# Altium footprint library AmbiqAndromeda.PcbLib: 48 footprints (part 3 of 3)
Each footprint in its own frame and in the unit in brackets; x right, y up, seen from the top. Pads: shape width x height; smd on the part's side, far side on the other; paste and mask are expansions set on the pad; w line width, h text height; cw(c..) or ccw(c..) is an arc to the next point about the centre after c.
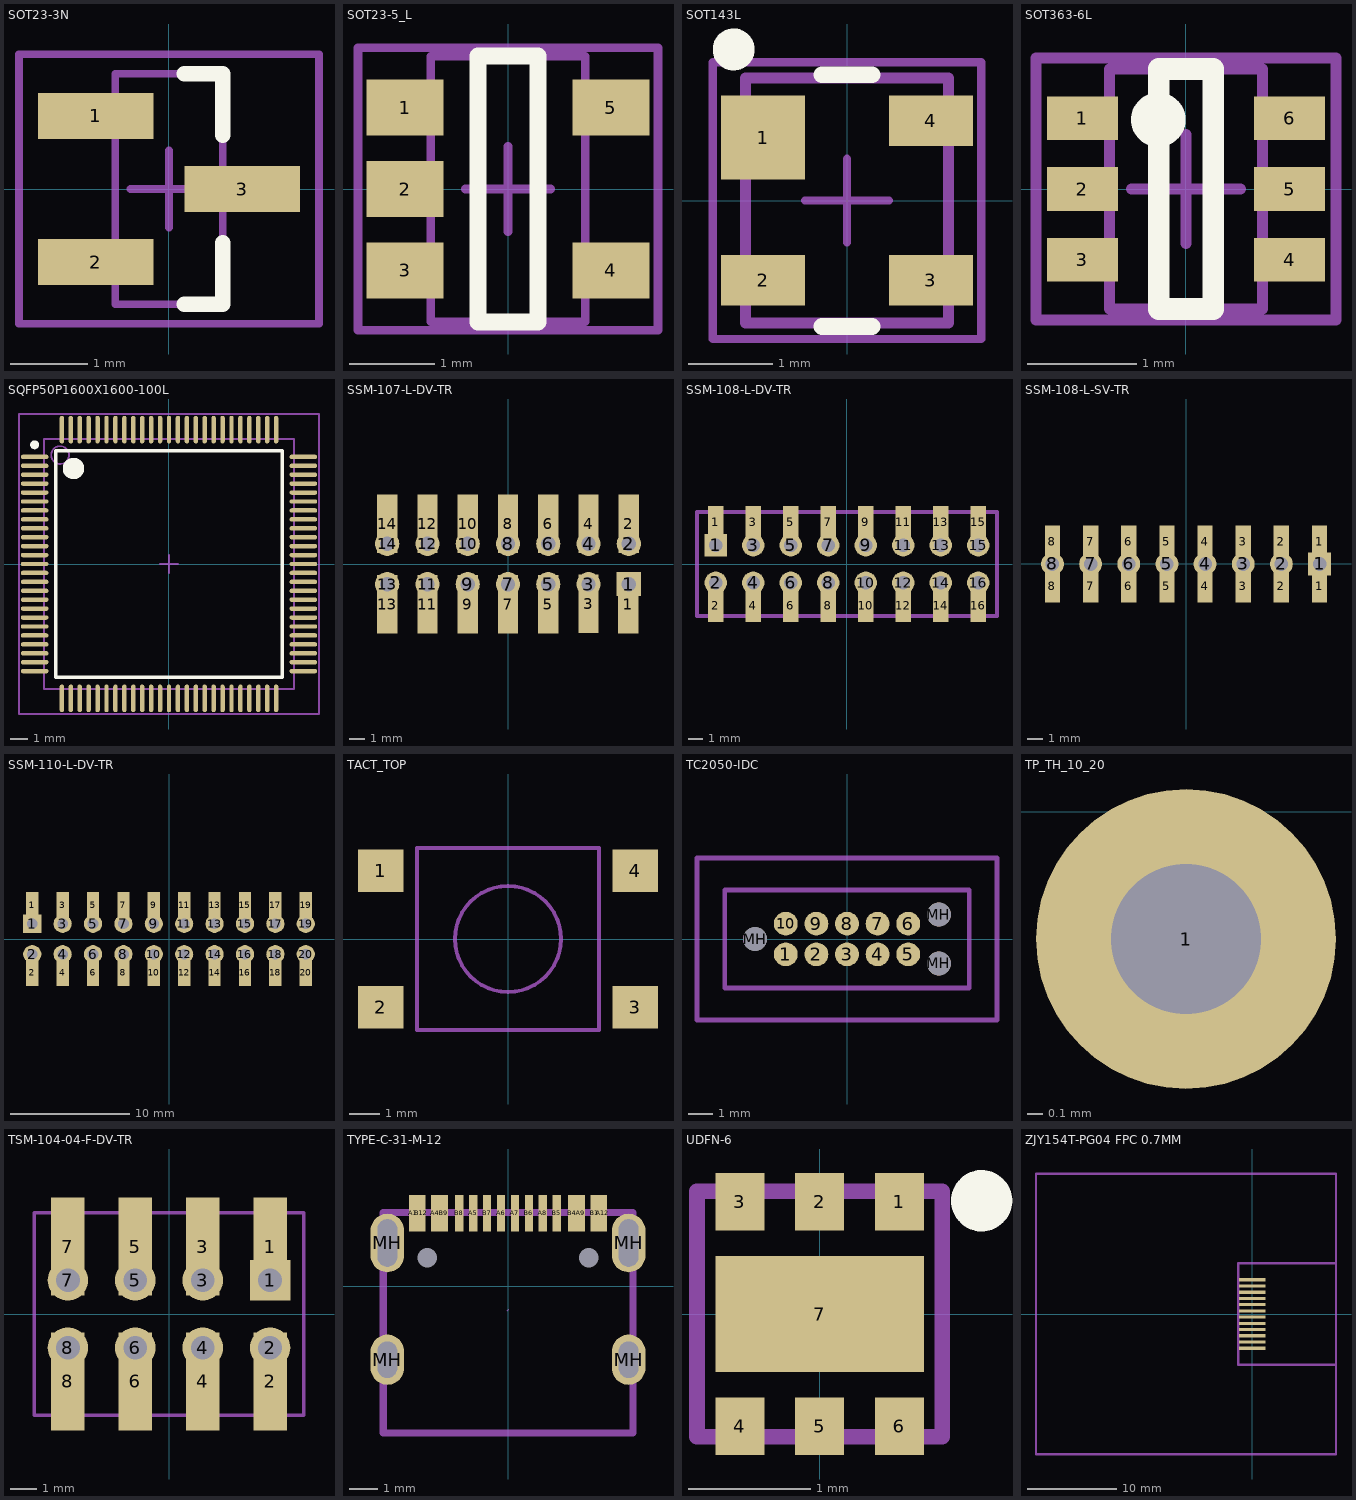
[diagram p2: the footprints below, top view; thin cyan lines are the x and y axes]

## SOT23-3N [mm] "SOT23, 3-Leads, Body 2.9x1.3mm, Pitch 0.95mm, Lead Span 2.5mm, IPC Medium Density"
height 1.1
pads (3):
  rect 1.5x0.6 smd: 1(-0.95,0.95) 2(-0.95,-0.95) 3(0.95,0)
Top Overlay:
  lines w0.2: 0.2,-1.5 0.7,-1.5 0.7,-0.7 ; 0.2,1.5 0.7,1.5 0.7,0.7
Mechanical 13:
  lines w0.1: -0.7,-1.5 -0.7,1.5 0.7,1.5 0.7,-1.5 -0.7,-1.5
Mechanical 15:
  lines w0.1: -0.5,0 0.5,0 ; 0,-0.5 0,0.5 ; -1.95,-1.75 -1.95,1.75 1.95,1.75 1.95,-1.75 -1.95,-1.75
3D body "SOT23.STEP": height 1.08, standoff 0, extent -1.345,-1.5 1.295,1.5

## SOT23-5_L [mm] "SOT23, 5-Leads, Body 2.9x1.6mm, Pitch 0.95mm, Lead Span 2.8mm, IPC High Density"
height 1.45
pads (5):
  rect 0.9x0.65 smd: 1(-1.2,0.95) 2(-1.2,0) 3(-1.2,-0.95) 4(1.2,-0.95) 5(1.2,0.95)
Top Overlay:
  lines w0.2: -0.35,-1.55 -0.35,1.55 0.35,1.55 0.35,-1.55 -0.35,-1.55
Mechanical 13:
  lines w0.1: -0.9,-1.55 0.9,-1.55 0.9,1.55 -0.9,1.55 -0.9,-1.55
Mechanical 15:
  lines w0.1: -0.5,0 0.5,0 ; 0,-0.5 0,0.5 ; -1.75,-1.65 1.75,-1.65 1.75,1.65 -1.75,1.65 -1.75,-1.65
3D body "User Library-SOT23-5.STEP": height 1.09, standoff -0.01, extent -1.451,-1.473 1.349,1.426

## SOT143L [mm] "SOT143, 4-Leads, Body 2.9x1.3mm, Pitch 1.9mm, Lead Span 2.5mm, IPC High Density"
height 1.1
pads (4):
  rect 1x1 smd: 1(-1,0.75)
  rect 1x0.6 smd: 2(-1,-0.95) 3(1,-0.95) 4(1,0.95)
Top Overlay:
  circle w0.25: c-1.35,1.8 r0.125
  lines w0.2: -0.3,-1.5 0.3,-1.5 ; -0.3,1.5 0.3,1.5
Mechanical 13:
  lines w0.127: -1.21,-1.46 -1.21,1.46 1.21,1.46 1.21,-1.46 -1.21,-1.46
Mechanical 15:
  lines w0.1: -0.5,0 0.5,0 ; 0,-0.5 0,0.5 ; -1.6,-1.65 -1.6,1.65 1.6,1.65 1.6,-1.65 -1.6,-1.65
3D body "User Library-sot143.STEP": height 1, standoff 0, extent -1.21,-1.46 1.21,1.46

## SOT363-6L [mm] "SOT363, 6-Leads, Body 2x1.3mm, Pitch 0.65mm, Lead Span 2.1mm, IPC High Density"
height 1
pads (6):
  rect 0.65x0.4 smd: 1(-0.95,0.65) 2(-0.95,0) 3(-0.95,-0.65) 4(0.95,-0.65) 5(0.95,0) 6(0.95,0.65)
Top Overlay:
  circle w0.25: c-0.254,0.635 r0.125
  lines w0.2: -0.25,-1.1 -0.25,1.1 0.25,1.1 0.25,-1.1 -0.25,-1.1
Mechanical 13:
  lines w0.1: -0.7,-1.1 0.7,-1.1 0.7,1.1 -0.7,1.1 -0.7,-1.1
Mechanical 15:
  lines w0.1: -0.5,0 0.5,0 ; 0,-0.5 0,0.5 ; -1.375,-1.2 1.375,-1.2 1.375,1.2 -1.375,1.2 -1.375,-1.2
3D body "User Library-sot363.STEP": height 1, standoff 0, extent -1.15,-1.05 1.15,1.05

## SQFP50P1600X1600-100L [mm] "Shrink QFP, 100-Leads, Body 14x14mm, Pitch 0.5mm, IPC High Density"
height 2.2
pads (100):
  oval 1.55x0.25 smd: 1(-7.525,6) 2(-7.525,5.5) 3(-7.525,5) 4(-7.525,4.5) 5(-7.525,4) 6(-7.525,3.5) 7(-7.525,3) 8(-7.525,2.5) 9(-7.525,2) 10(-7.525,1.5) 11(-7.525,1) 12(-7.525,0.5) 13(-7.525,0) 14(-7.525,-0.5) 15(-7.525,-1) 16(-7.525,-1.5) 17(-7.525,-2) 18(-7.525,-2.5) 19(-7.525,-3) 20(-7.525,-3.5) 21(-7.525,-4) 22(-7.525,-4.5) 23(-7.525,-5) 24(-7.525,-5.5) 25(-7.525,-6) 51(7.525,-6) 52(7.525,-5.5) 53(7.525,-5) 54(7.525,-4.5) 55(7.525,-4) 56(7.525,-3.5) 57(7.525,-3) 58(7.525,-2.5) 59(7.525,-2) 60(7.525,-1.5) 61(7.525,-1) 62(7.525,-0.5) 63(7.525,0) 64(7.525,0.5) 65(7.525,1) 66(7.525,1.5) 67(7.525,2) 68(7.525,2.5) 69(7.525,3) 70(7.525,3.5) 71(7.525,4) 72(7.525,4.5) 73(7.525,5) 74(7.525,5.5) 75(7.525,6)
  oval 0.25x1.55 smd: 26(-6,-7.525) 27(-5.5,-7.525) 28(-5,-7.525) 29(-4.5,-7.525) 30(-4,-7.525) 31(-3.5,-7.525) 32(-3,-7.525) 33(-2.5,-7.525) 34(-2,-7.525) 35(-1.5,-7.525) 36(-1,-7.525) 37(-0.5,-7.525) 38(0,-7.525) 39(0.5,-7.525) 40(1,-7.525) 41(1.5,-7.525) 42(2,-7.525) 43(2.5,-7.525) 44(3,-7.525) 45(3.5,-7.525) 46(4,-7.525) 47(4.5,-7.525) 48(5,-7.525) 49(5.5,-7.525) 50(6,-7.525) 76(6,7.525) 77(5.5,7.525) 78(5,7.525) 79(4.5,7.525) 80(4,7.525) 81(3.5,7.525) 82(3,7.525) 83(2.5,7.525) 84(2,7.525) 85(1.5,7.525) 86(1,7.525) 87(0.5,7.525) 88(0,7.525) 89(-0.5,7.525) 90(-1,7.525) 91(-1.5,7.525) 92(-2,7.525) 93(-2.5,7.525) 94(-3,7.525) 95(-3.5,7.525) 96(-4,7.525) 97(-4.5,7.525) 98(-5,7.525) 99(-5.5,7.525) 100(-6,7.525)
Top Overlay:
  circle w0.25: c-7.525,6.675 r0.125
  circle w0.6: c-5.35,5.35 r0.3
  lines w0.2: -6.35,-6.35 -6.35,6.35 6.35,6.35 6.35,-6.35 -6.35,-6.35
Mechanical 13:
  circle w0.1: c-6.1,6.1 r0.5
  lines w0.1: -7,-7 -7,7 7,7 7,-7 -7,-7
Mechanical 15:
  lines w0.1: -0.5,0 0.5,0 ; 0,-0.5 0,0.5 ; -8.4,-8.4 -8.4,8.4 8.4,8.4 8.4,-8.4 -8.4,-8.4
3D body "LQFP100-14x14.STEP": height 1.45, standoff 0, extent -8,-8 8,8

## SSM-107-L-DV-TR [mil]
pads (28):
  rect 50x145 smd mask+2: 1(298.48,-100) 2(300,100) 3(200,-99.01) 4(200,100) 5(100,-100) 6(100,100) 7(0,-100) 8(0,100) 9(-100,-100) 10(-100,100) 11(-200,-100) 12(-200,100) 13(-300,-100) 14(-300,100)
  rect 60x60 hole 35.43: 1(300,-50)
  rrect100% 60x60 hole 35.43: 2(300,50) 3(200,-50) 4(200,50) 5(100,-50) 6(100,50) 7(0,-50) 8(0,50) 9(-100,-50) 10(-100,50) 11(-200,-50) 12(-200,50) 13(-300,-50) 14(-300,50)
3D body "SSM-107-L-DV.stp": height 290, standoff -2, extent -349.99,-138.5 350.01,138.5

## SSM-108-L-DV-TR [mil]
pads (32):
  rect 60x60 hole 35.43: 1(-350,50)
  rect 40.16x87.4 smd: 1(-350,111.26) 2(-350,-111.26) 3(-250,111.26) 4(-250,-111.26) 5(-150,111.26) 6(-150,-111.26) 7(-50,111.26) 8(-50,-111.26) 9(50,111.26) 10(50,-111.26) 11(150,111.26) 12(150,-111.26) 13(250,111.26) 14(250,-111.26) 15(350,111.26) 16(350,-111.26)
  round 60 hole 35.43: 2(-350,-50)
  rrect100% 60x60 hole 35.43: 3(-250,50) 4(-250,-50) 5(-150,50) 6(-150,-50) 7(-50,50) 8(-50,-50) 9(50,50) 10(50,-50) 11(150,50) 12(150,-50) 13(250,50) 14(250,-50) 15(350,50) 16(350,-50)
Top Paste:
  rectangle: 329.92,-154.96 370.08,-67.56
  rectangle: 329.92,67.56 370.08,154.96
  rectangle: 229.92,-154.96 270.08,-67.56
  rectangle: 229.92,67.56 270.08,154.96
  rectangle: 129.92,-154.96 170.08,-67.56
  rectangle: 129.92,67.56 170.08,154.96
  rectangle: 29.92,-154.96 70.08,-67.56
  rectangle: 29.92,67.56 70.08,154.96
  rectangle: -70.08,-154.96 -29.92,-67.56
  rectangle: -70.08,67.56 -29.92,154.96
  rectangle: -170.08,-154.96 -129.92,-67.56
  rectangle: -170.08,67.56 -129.92,154.96
  rectangle: -270.08,-154.96 -229.92,-67.56
  rectangle: -270.08,67.56 -229.92,154.96
  rectangle: -370.08,-154.96 -329.92,-67.56
  rectangle: -370.08,67.56 -329.92,154.96
Top Solder:
  rectangle: 327.91,-156.97 372.09,-65.55
  rectangle: 327.91,65.55 372.09,156.97
  rectangle: 227.91,-156.97 272.09,-65.55
  rectangle: 227.91,65.55 272.09,156.97
  rectangle: 127.91,-156.97 172.09,-65.55
  rectangle: 127.91,65.55 172.09,156.97
  rectangle: 27.91,-156.97 72.09,-65.55
  rectangle: 27.91,65.55 72.09,156.97
  rectangle: -72.09,-156.97 -27.91,-65.55
  rectangle: -72.09,65.55 -27.91,156.97
  rectangle: -172.09,-156.97 -127.91,-65.55
  rectangle: -172.09,65.55 -127.91,156.97
  rectangle: -272.09,-156.97 -227.91,-65.55
  rectangle: -272.09,65.55 -227.91,156.97
  rectangle: -372.09,-156.97 -327.91,-65.55
  rectangle: -372.09,65.55 -327.91,156.97
Mechanical 13:
  lines w10: -399.99,-138.49 400.01,-138.49 400.01,138.51 -399.99,138.51 -399.99,-138.49
3D body "SSM-108-L-DV.stp": height 290, standoff -2, extent -399.99,-138.49 400.01,138.51

## SSM-108-L-SV-TR [mm]
height 0.71
pads (24):
  rect 1.02x2.19 smd: 1(8.89,-1.465) 1(8.89,1.465) 2(6.35,-1.465) 2(6.35,1.465) 3(3.81,-1.465) 3(3.81,1.465) 4(1.27,-1.465) 4(1.27,1.465) 5(-1.27,-1.465) 5(-1.27,1.465) 6(-3.81,-1.465) 6(-3.81,1.465) 7(-6.35,-1.465) 7(-6.35,1.465) 8(-8.89,-1.465) 8(-8.89,1.465)
  rect 1.524x1.524 hole 0.9: 1(8.89,0)
  rrect100% 1.524x1.524 hole 0.9: 2(6.35,0) 3(3.81,0) 4(1.27,0) 5(-1.27,0) 6(-3.81,0) 7(-6.35,0) 8(-8.89,0)
3D body "SSM-108-L-SV-TR.stp": height 7.52, standoff 0.02, extent -10.16,-2.286 10.16,2.286

## SSM-110-L-DV-TR [mil]
pads (40):
  rect 60x60 hole 35.43: 1(-450,50)
  rect 40.16x87.4 smd: 1(-450,111.26) 2(-450,-111.26) 3(-350,111.26) 4(-350,-111.26) 5(-250,111.26) 6(-250,-111.26) 7(-150,111.26) 8(-150,-111.26) 9(-50,111.26) 10(-50,-111.26) 11(50,111.26) 12(50,-111.26) 13(150,111.26) 14(150,-111.26) 15(250,111.26) 16(250,-111.26) 17(350,111.26) 18(350,-111.26) 19(450,111.26) 20(450,-111.26)
  round 60 hole 35.43: 2(-450,-50)
  rrect100% 60x60 hole 35.43: 3(-350,50) 4(-350,-50) 5(-250,50) 6(-250,-50) 7(-150,50) 8(-150,-50) 9(-50,50) 10(-50,-50) 11(50,50) 12(50,-50) 13(150,50) 14(150,-50) 15(250,50) 16(250,-50) 17(350,50) 18(350,-50) 19(450,50) 20(450,-50)
Top Paste:
  rectangle: 429.92,-154.96 470.08,-67.56
  rectangle: 429.92,67.56 470.08,154.96
  rectangle: 329.92,-154.96 370.08,-67.56
  rectangle: 329.92,67.56 370.08,154.96
  rectangle: 229.92,-154.96 270.08,-67.56
  rectangle: 229.92,67.56 270.08,154.96
  rectangle: 129.92,-154.96 170.08,-67.56
  rectangle: 129.92,67.56 170.08,154.96
  rectangle: 29.92,-154.96 70.08,-67.56
  rectangle: 29.92,67.56 70.08,154.96
  rectangle: -70.08,-154.96 -29.92,-67.56
  rectangle: -70.08,67.56 -29.92,154.96
  rectangle: -170.08,-154.96 -129.92,-67.56
  rectangle: -170.08,67.56 -129.92,154.96
  rectangle: -270.08,-154.96 -229.92,-67.56
  rectangle: -270.08,67.56 -229.92,154.96
  rectangle: -370.08,-154.96 -329.92,-67.56
  rectangle: -370.08,67.56 -329.92,154.96
  rectangle: -470.08,-154.96 -429.92,-67.56
  rectangle: -470.08,67.56 -429.92,154.96
Top Solder:
  rectangle: 427.91,-156.97 472.09,-65.55
  rectangle: 427.91,65.55 472.09,156.97
  rectangle: 327.91,-156.97 372.09,-65.55
  rectangle: 327.91,65.55 372.09,156.97
  rectangle: 227.91,-156.97 272.09,-65.55
  rectangle: 227.91,65.55 272.09,156.97
  rectangle: 127.91,-156.97 172.09,-65.55
  rectangle: 127.91,65.55 172.09,156.97
  rectangle: 27.91,-156.97 72.09,-65.55
  rectangle: 27.91,65.55 72.09,156.97
  rectangle: -72.09,-156.97 -27.91,-65.55
  rectangle: -72.09,65.55 -27.91,156.97
  rectangle: -172.09,-156.97 -127.91,-65.55
  rectangle: -172.09,65.55 -127.91,156.97
  rectangle: -272.09,-156.97 -227.91,-65.55
  rectangle: -272.09,65.55 -227.91,156.97
  rectangle: -372.09,-156.97 -327.91,-65.55
  rectangle: -372.09,65.55 -327.91,156.97
  rectangle: -472.09,-156.97 -427.91,-65.55
  rectangle: -472.09,65.55 -427.91,156.97
3D body "SSM-110-L-DV.stp": height 290, standoff -2, extent -499.99,-138.49 500.01,138.51

## TACT_TOP [mm] "Tact Switch Side Push"
pads (4):
  rect 1.5x1.4 smd mask+0: 1(-4.2,2.25) 2(-4.2,-2.25) 3(4.2,-2.25) 4(4.2,2.25)
Mechanical 13:
  circle w0.127: c0,0 r1.75
  lines w0.127: -3,-3 3,-3 3,3 -3,3 -3,0 -3,-3
3D body "TSW SMD-6x6x4.3.STEP": height 4.25, standoff 0.05, extent -4.5,-3 4.5,3

## TC2050-IDC [mil]
height 27.95
pads (13):
  round 39 smd paste-20: 1(-100,-25) 2(-50,-25) 3(0,-25) 4(50,-25) 5(100,-25) 6(100,25) 7(50,25) 8(0,25) 9(-50,25) 10(-100,25)
  round 39 hole 39 unplated: MH(-150,0) MH(150,-40) MH(150,40)
Mechanical 13:
  lines w7.87: -199.8,-79.92 199.8,-79.92 199.8,79.92 -199.8,79.92 -199.8,-79.92
Mechanical 15:
  lines w7.87: -245,-132.5 -245,132.5 245,132.5 245,-132.5 -245,-132.5

## TP_TH_10_20 [mm]
height 0.71
pads (1):
  round 2 hole 1: 1(-2.049,-0.847)

## TSM-104-04-F-DV-TR [mil]
pads (16):
  rect 60x60 hole 35.43: 1(150,50)
  rect 50x145 smd mask+2: 1(150,100) 2(150,-100) 3(50,100) 4(50,-100) 5(-50,100) 6(-50,-100) 7(-150,100) 8(-150,-100)
  rrect100% 60x60 hole 35.43: 2(150,-50) 3(50,50) 4(50,-50) 5(-50,50) 6(-50,-50) 7(-150,50) 8(-150,-50)
Mechanical 13:
  lines w5: -200,-150 -200,150 200,150 200,-150 -200,-150
3D body "TSM-104-01-L-DV.stp": height 378.43, standoff -1.57, extent -199.99,-151.49 200.01,151.51

## TYPE-C-31-M-12 [mm]
pads (22):
  rect 0.3x1.3 smd: A1(-3.4,2.623) A4(-2.6,2.623) A5(-1.25,2.623) A6(-0.25,2.623) A7(0.25,2.623) A8(1.25,2.624) A9(2.6,2.623) A12(3.4,2.623) B1(3.1,2.623) B4(2.3,2.623) B5(1.75,2.623) B6(0.75,2.623) B7(-0.75,2.623) B8(-1.75,2.624) B9(-2.3,2.623) B12(-3.1,2.623)
  oval 1.2x1.8 hole 0.7 slot 1.3 at 90 deg: MH(-4.32,-2.624) MH(4.32,-2.624)
  oval 1.2x2.1 hole 0.7 slot 1.7 at 90 deg: MH(-4.32,1.556) MH(4.32,1.556)
  round 0.1 hole 0.7 unplated: MH(-2.89,1.026) MH(2.89,1.026)
Mechanical 13:
  lines w0.254: -4.465,-5.25 -4.465,2.65 4.475,2.65 4.475,-5.25 -4.465,-5.25
Mechanical 15:
  lines w0.003: -0.025,-0.869 0.025,-0.818
3D body "HRO  TYPE-C-31-M-12.step": height 3.21, standoff -1, extent -4.465,-5.25 4.475,2.65

## UDFN-6 [mm]
height 0.71
pads (7):
  rect 0.4x0.47 smd: 1(0.65,0.915) 2(0,0.915) 3(-0.65,0.915) 4(-0.65,-0.915) 5(0,-0.915) 6(0.65,-0.915)
  rect 1.7x0.95 smd: 7(0,0)
Top Overlay:
  circle w0.25: c1.322,0.924 r0.125
Mechanical 13:
  lines w0.127: -1,-1 -1,1 1,1 1,-1 -1,-1
3D body "User Library-UDFN6.STEP": height 0.63, standoff -0.02, extent -1,-1 1,1

## ZJY154T-PG04 FPC 0.7MM [mm]
pads (12):
  rect 3x0.35 smd: 1(0,3.85) 2(0,3.15) 3(0,2.45) 4(0,1.75) 5(0,1.05) 6(0,0.35) 7(0,-0.35) 8(0,-1.05) 9(0,-1.75) 10(0,-2.45) 11(0,-3.15) 12(0,-3.85)
Mechanical 13:
  lines w0.254: 9.4,-5.7 -1.6,-5.7 -1.6,5.7 9.4,5.7 ; -24.32,-15.76 9.4,-15.76 9.4,15.76 -24.32,15.76 -24.32,-15.76